# Altium footprint library LegacySMD-RCL.PcbLib: 110 footprints (part 6 of 7)
Each footprint in its own frame and in the unit in brackets; x right, y up, seen from the top. Pads: shape width x height; smd on the part's side, far side on the other; paste and mask are expansions set on the pad; w line width, h text height; cw(c..) or ccw(c..) is an arc to the next point about the centre after c.
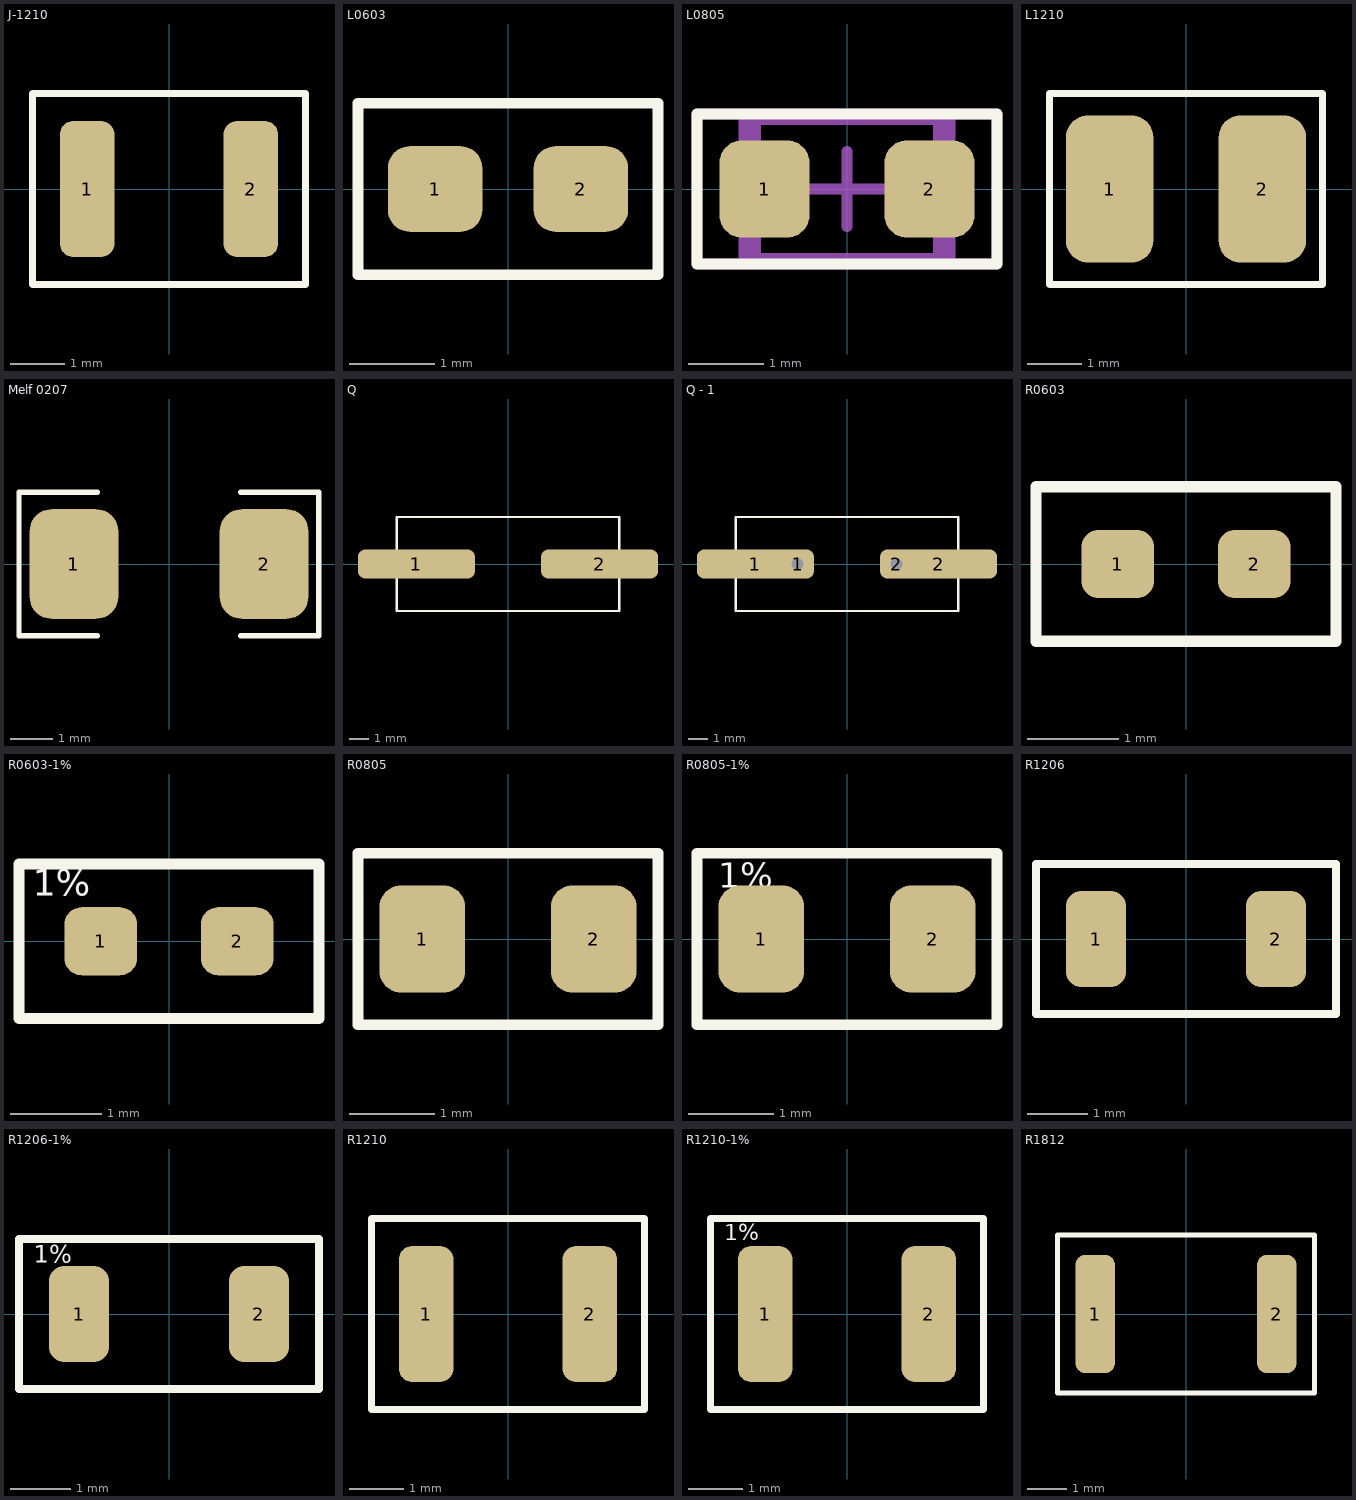
[diagram p5: the footprints below, top view; thin cyan lines are the x and y axes]

## J-1210 [mm]
pads (2):
  rrect50% 1x2.5 smd: 1(-1.5,0) 2(1.5,0)
Top Overlay:
  lines w0.125: -2.5,-1.75 -2.5,1.75 2.5,1.75 2.5,-1.75 -2.5,-1.75
3D body "SMD R-1210.STEP": height 0.6, standoff 0, extent -1.6,-1.25 1.6,1.25

## L0603 [mm]
pads (2):
  rrect50% 1.1x1 smd: 1(-0.85,0) 2(0.85,0)
Top Overlay:
  lines w0.125: -1.75,-1 1.75,-1 1.75,1 -1.75,1 -1.75,-1
3D body "L SLF 0603.STEP": height 1, standoff -0.02, extent -0.9,-0.56 0.9,0.56

## L0805 [mm]
pads (2):
  rrect50% 1.2x1.3 smd: 1(-1.1,0) 2(1.1,0)
Top Overlay:
  lines w0.15: -2,-1 2,-1 2,1 -2,1 -2,-1
Assembly_Text_Top:
  text ".Designator / .Comment" at -1.75,-0.75 h0.8
Assembly_draw:
  rectangle: -1.4,-0.9 -1.2,0.9
  rectangle: 1.2,-0.9 1.4,0.9
  lines w0.1: -1.2,-0.9 -1.2,0.9 ; 1.2,-0.9 1.2,0.9 ; -1.4,-0.9 -1.4,0.9 1.4,0.9 1.4,-0.9 -1.4,-0.9
Mechanical_clearance:
  lines w0.15: -0.5,0 0.5,0 ; 0,-0.5 0,0.5 ; -2,-1 2,-1 2,1 -2,1 -2,-1
3D body "L 0805HT.STEP": height 0.88, standoff -0.01, extent -1.05,-0.787 1.05,0.787

## L1210 [mm]
pads (2):
  rrect50% 1.6x2.7 smd: 1(-1.4,0) 2(1.4,0)
Top Overlay:
  lines w0.125: -2.5,-1.75 2.5,-1.75 2.5,1.75 -2.5,1.75 -2.5,-1.75
3D body "SMD R-1210.STEP": height 0.6, standoff 0, extent -1.6,-1.251 1.6,1.249

## Melf 0207 [mm] "Metal Electrode Face (MELF) Diode; Body 5 x 2.5 mm (LxDia)"
height 2.5
pads (2):
  rrect50% 2.1x2.6 smd: 1(-2.25,0) 2(2.25,0)
Top Overlay:
  lines w0.125: -1.7,-1.7 -3.55,-1.7 -3.55,1.7 -1.7,1.7 ; 1.7,-1.7 3.545,-1.7 3.545,1.7 1.7,1.7
3D body "Melf 0207-1.STEP": height 2.2, standoff 0, extent -2.65,-1.1 2.65,1.1

## Q [mm]
pads (2):
  rrect50% 6x1.5 smd: 1(-4.699,0) 2(4.699,0)
Top Overlay:
  lines w0.125: -5.715,-2.413 -5.715,2.413 5.715,2.413 5.715,-2.413 -5.715,-2.413

## Q - 1 [mm]
pads (4):
  rrect50% 6x1.5 smd: 1(-4.699,0) 2(4.699,0)
  rrect50% 1.2x1.2 hole 0.6: 1(-2.54,0) 2(2.54,0)
Top Overlay:
  lines w0.125: -5.715,-2.413 5.715,-2.413 5.715,2.413 -5.715,2.413 -5.715,-2.413

## R0603 [mm]
pads (2):
  rrect50% 0.8x0.75 smd: 1(-0.75,0) 2(0.75,0)
Top Overlay:
  lines w0.125: -1.65,-0.85 1.65,-0.85 1.65,0.85 -1.65,0.85 -1.65,-0.85
3D body "SMD R-0603.STEP": height 0.45, standoff -0.01, extent -0.8,-0.4 0.8,0.4

## R0603-1% [mm]
pads (2):
  rrect50% 0.8x0.75 smd: 1(-0.75,0) 2(0.75,0)
Top Overlay:
  lines w0.125: -1.65,-0.85 1.65,-0.85 1.65,0.85 -1.65,0.85 -1.65,-0.85
  text "1%" at -1.5,0.4 h0.5
3D body "SMD R-0603-1%.STEP": height 0.45, standoff 0, extent -0.8,-0.405 0.8,0.395

## R0805 [mm]
pads (2):
  rrect50% 1x1.25 smd: 1(-1,0) 2(1,0)
Top Overlay:
  lines w0.125: -1.75,-1 1.75,-1 1.75,1 -1.75,1 -1.75,-1
3D body "R-0805.STEP": height 0.6, standoff 0, extent -1,-0.625 1,0.625

## R0805-1% [mm]
pads (2):
  rrect50% 1x1.25 smd: 1(-1,0) 2(1,0)
Top Overlay:
  lines w0.125: -1.75,-1 -1.75,1 1.75,1 1.75,-1 -1.75,-1
  text "1%" at -1.5,0.5 h0.5
3D body "SMD R-0805-1%.STEP": height 0.6, standoff 0, extent -1,-0.625 1,0.625

## R1206 [mm]
pads (2):
  rrect50% 1x1.6 smd: 1(-1.5,0) 2(1.5,0)
Top Overlay:
  lines w0.125: -2.5,-1.25 -2.5,1.25 2.5,1.25 2.5,-1.25 -2.5,-1.25
3D body "R-1206 (2).STEP": height 0.6, standoff 0, extent -1.6,-0.8 1.6,0.8

## R1206-1% [mm]
pads (2):
  rrect50% 1x1.6 smd: 1(-1.5,0) 2(1.5,0)
Top Overlay:
  lines w0.125: -2.5,-1.25 2.5,-1.25 2.5,1.25 -2.5,1.25 -2.5,-1.25
  text "1%" at -2.25,0.75 h0.5
3D body "SMD R-1206-1%.STEP": height 0.6, standoff 0, extent -1.6,-0.8 1.6,0.8

## R1210 [mm]
pads (2):
  rrect50% 1x2.5 smd: 1(-1.5,0) 2(1.5,0)
Top Overlay:
  lines w0.125: -2.5,-1.75 -2.5,1.75 2.5,1.75 2.5,-1.75 -2.5,-1.75
3D body "SMD R-1210.STEP": height 0.6, standoff 0, extent -1.6,-1.25 1.6,1.25

## R1210-1% [mm]
pads (2):
  rrect50% 1x2.5 smd: 1(-1.5,0) 2(1.5,0)
Top Overlay:
  lines w0.125: -2.5,-1.75 -2.5,1.75 2.5,1.75 2.5,-1.75 -2.5,-1.75
  text "1%" at -2.25,1.25 h0.5
3D body "SMD R-1210-1%.STEP": height 0.6, standoff 0, extent -1.6,-1.25 1.6,1.25

## R1812 [mm]
pads (2):
  rrect50% 1x3 smd: 1(-2.3,0) 2(2.3,0)
Top Overlay:
  lines w0.125: -3.25,-2 -3.25,2 3.25,2 3.25,-2 -3.25,-2
3D body "SMD R-1812.STEP": height 0.6, standoff 0, extent -2.25,-1.6 2.25,1.6